# Altium footprint library Electronic Devices_LIB.PcbLib: 410 footprints (part 1 of 26)
Each footprint in its own frame and in the unit in brackets; x right, y up, seen from the top. Pads: shape width x height; smd on the part's side, far side on the other; paste and mask are expansions set on the pad; w line width, h text height; cw(c..) or ccw(c..) is an arc to the next point about the centre after c.
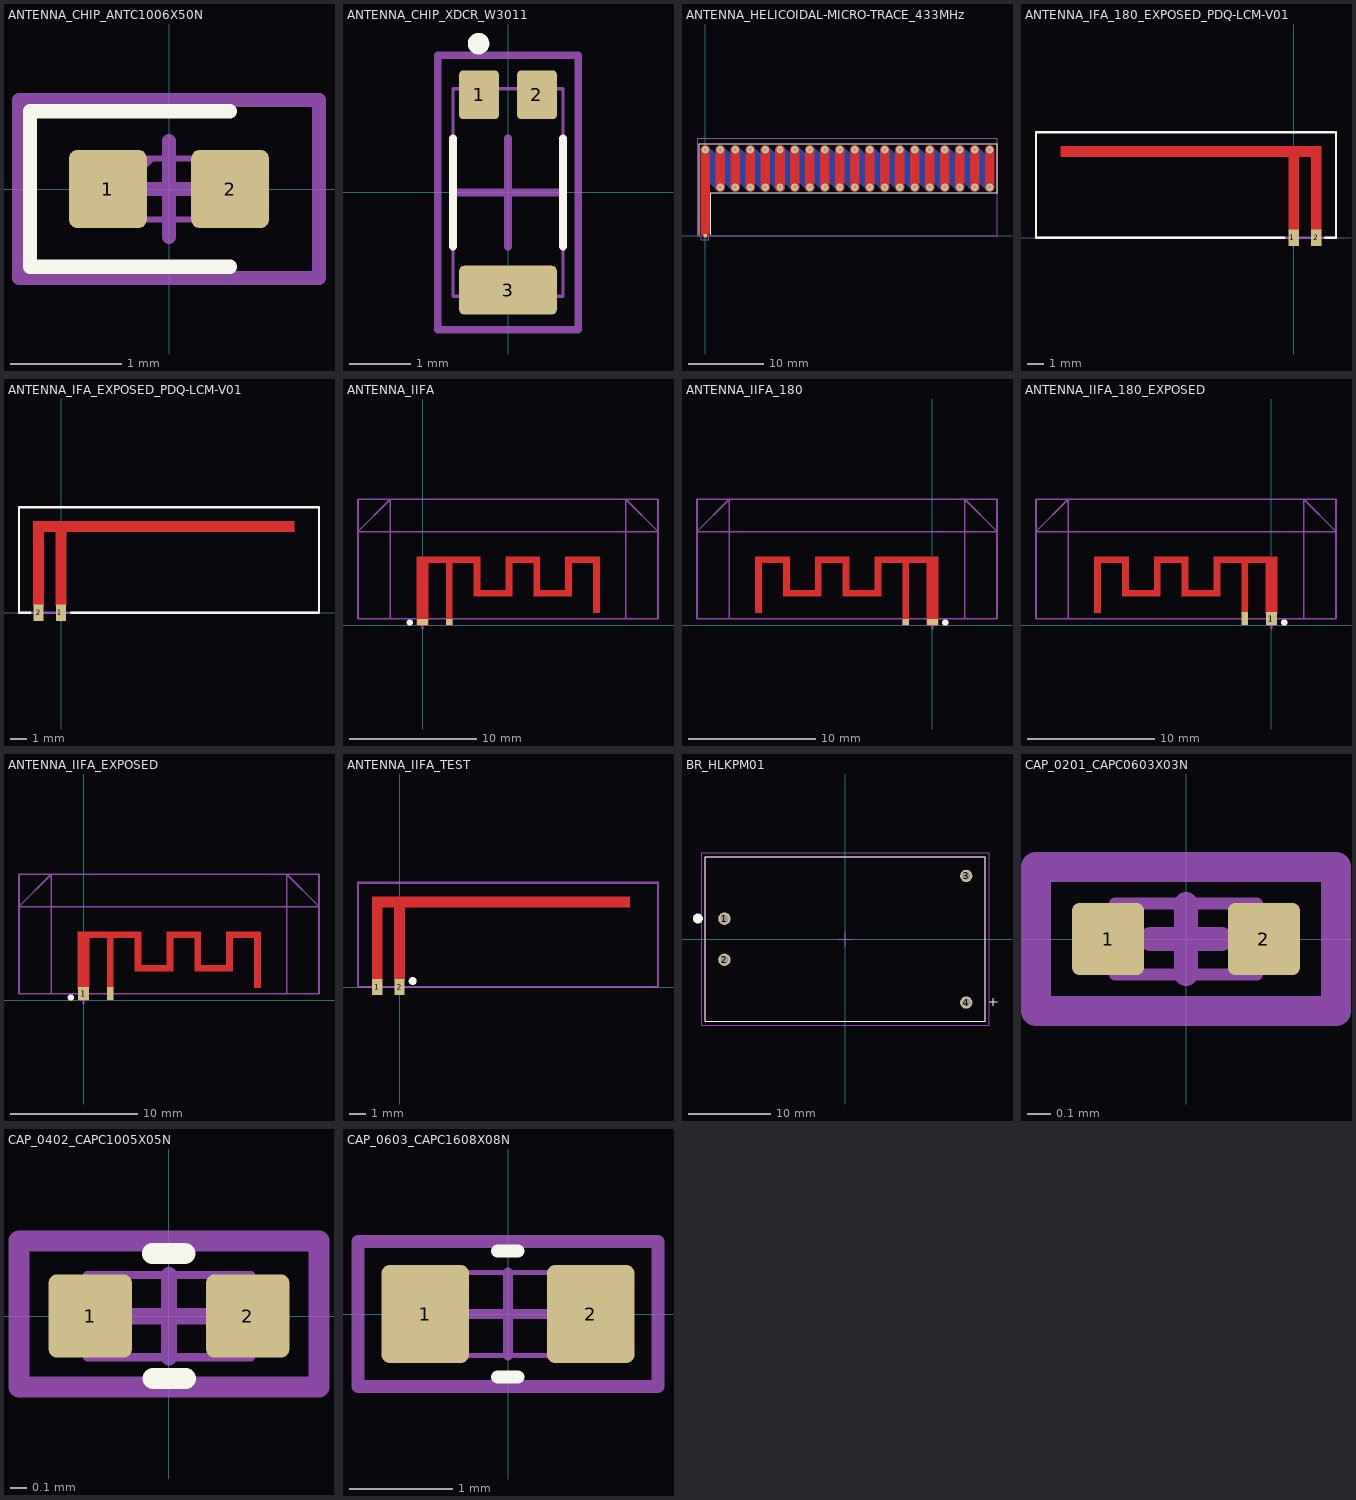
[diagram p0: the footprints below, top view; thin cyan lines are the x and y axes]

## ANTENNA_CHIP_ANTC1006X50N [mm] "1x0.55 mm"
height 0.4
pads (2):
  rrect20% 0.7x0.7 smd: 1(-0.55,0) 2(0.55,0)
Top Overlay:
  lines w0.127: 0.55,-0.7 -1.25,-0.7 -1.25,0.7 0.55,0.7
Mechanical 1:
  lines w0.051: -0.5,-0.075 -0.15,0.275 ; -0.5,-0.275 -0.5,0.275 0.5,0.275 0.5,-0.275 -0.5,-0.275
Top Assembly:
  text ".Designator" at -3.48,-0.275 h0.7
Top Courtyard:
  lines w0.127: -0.432,0 0,0 ; 0,-0.432 0,0 ; 0,0.432 0,0 ; 0.432,0 0,0 ; -1.35,-0.8 -1.35,0.8 1.35,0.8 1.35,-0.8 -1.35,-0.8
3D body "A9001978.stp": height 0.5, standoff 0, extent -0.5,-0.275 0.5,0.275

## ANTENNA_CHIP_XDCR_W3011 [mm]
pads (3):
  rrect20% 0.65x0.8 smd: 1(-0.475,1.6) 2(0.475,1.6)
  rrect20% 1.6x0.8 smd: 3(0,-1.6)
Top Overlay:
  circle w0.2: c-0.483,2.438 r0.076
  lines w0.127: -0.9,-0.887 -0.9,0.887 ; 0.9,-0.887 0.9,0.887
Top Paste:
  region: 0.75,1.25 0.2,1.25 0.2,1.95 0.75,1.95
  region: -0.2,1.25 -0.75,1.25 -0.75,1.95 -0.2,1.95
  region: 0.75,-1.95 -0.75,-1.95 -0.75,-1.25 0.75,-1.25
Top Solder:
  region: 0.85,1.15 0.1,1.15 0.1,2 0.85,2
  region: -0.1,1.15 -0.85,1.15 -0.85,2 -0.1,2
  region: 0.85,-2 -0.85,-2 -0.85,-1.15 0.85,-1.15
Top Assembly:
  lines w0.051: -0.9,-1.7 0.9,-1.7 0.9,1.7 -0.9,1.7 -0.9,-1.7
  text ".Designator" at -2.565,-0.161 h0.51
Top Courtyard:
  lines w0.127: -0.889,0 0,0 ; 0,-0.889 0,0 ; 0,0.889 0,0 ; 0.889,0 0,0 ; -1.15,-2.25 -1.15,2.25 1.15,2.25 1.15,-2.25 -1.15,-2.25

## ANTENNA_HELICOIDAL-MICRO-TRACE_433MHz [mil] "Micro Helical Trace Antenna, 433MHz, Must have matching network to achieve 50R"
pads (1):
  rrect20% 20x20 smd mask-1.97: 1(0,0)
via 1496.06,452.76 diameter 39.37 hole 14.96
via 1496.06,255.91 diameter 39.37 hole 14.96
via 1417.32,255.91 diameter 39.37 hole 14.96
via 1338.58,452.76 diameter 39.37 hole 14.96
via 1338.58,255.91 diameter 39.37 hole 14.96
via 1259.84,452.76 diameter 39.37 hole 14.96
via 1259.84,255.91 diameter 39.37 hole 14.96
via 1181.1,452.76 diameter 39.37 hole 14.96
via 1102.36,452.76 diameter 39.37 hole 14.96
via 1181.1,255.91 diameter 39.37 hole 14.96
via 1102.36,255.91 diameter 39.37 hole 14.96
via 1023.62,452.76 diameter 39.37 hole 14.96
via 1023.62,255.91 diameter 39.37 hole 14.96
via 944.88,452.76 diameter 39.37 hole 14.96
via 866.14,452.76 diameter 39.37 hole 14.96
via 944.88,255.91 diameter 39.37 hole 14.96
via 866.14,255.91 diameter 39.37 hole 14.96
via 787.4,452.76 diameter 39.37 hole 14.96
via 787.4,255.91 diameter 39.37 hole 14.96
via 78.74,452.76 diameter 39.37 hole 14.96
via 0,452.76 diameter 39.37 hole 14.96
via 78.74,255.91 diameter 39.37 hole 14.96
via 157.48,255.91 diameter 39.37 hole 14.96
via 157.48,452.76 diameter 39.37 hole 14.96
via 236.22,452.76 diameter 39.37 hole 14.96
via 236.22,255.91 diameter 39.37 hole 14.96
via 314.96,255.91 diameter 39.37 hole 14.96
via 314.96,452.76 diameter 39.37 hole 14.96
via 393.7,452.76 diameter 39.37 hole 14.96
via 393.7,255.91 diameter 39.37 hole 14.96
via 472.44,255.91 diameter 39.37 hole 14.96
via 472.44,452.76 diameter 39.37 hole 14.96
via 551.18,452.76 diameter 39.37 hole 14.96
via 551.18,255.91 diameter 39.37 hole 14.96
via 629.92,255.91 diameter 39.37 hole 14.96
via 629.92,452.76 diameter 39.37 hole 14.96
via 708.66,255.91 diameter 39.37 hole 14.96
via 708.66,452.76 diameter 39.37 hole 14.96
via 1417.32,452.76 diameter 39.37 hole 14.96
Top Layer:
  lines w50: 0,19.68 0,452.76 ; 78.74,255.91 78.74,452.76 ; 157.48,255.91 157.48,452.76 ; 236.22,255.91 236.22,452.76 ; 314.96,255.91 314.96,452.76 ; 393.7,255.91 393.7,452.76 ; 472.44,255.91 472.44,452.76 ; 551.18,255.91 551.18,452.76 ; 629.92,255.91 629.92,452.76 ; 708.66,255.91 708.66,452.76 ; 787.4,255.91 787.4,452.76 ; 866.14,255.91 866.14,452.76 ; 944.88,255.91 944.88,452.76 ; 1023.62,255.91 1023.62,452.76 ; 1102.36,255.91 1102.36,452.76 ; 1181.1,255.91 1181.1,452.76 ; 1259.84,255.91 1259.84,452.76 ; 1338.58,255.91 1338.58,452.76 ; 1417.32,255.91 1417.32,452.76 ; 1496.06,255.91 1496.06,452.76
Bottom Layer:
  lines w39.37: 629.92,255.91 629.92,255.91
  lines w50: 0,452.76 39.37,413.39 39.37,295.28 78.74,255.91 ; 78.74,452.76 118.11,413.39 118.11,295.28 157.48,255.91 ; 157.48,452.76 196.85,413.39 196.85,295.28 236.22,255.91 ; 236.22,452.76 275.59,413.39 275.59,295.28 314.96,255.91 ; 314.96,452.76 354.33,413.39 354.33,295.28 393.7,255.91 ; 393.7,452.76 433.07,413.39 433.07,295.28 472.44,255.91 ; 472.44,452.76 511.81,413.39 511.81,295.28 551.18,255.91 ; 551.18,452.76 590.55,413.39 590.55,295.28 629.92,255.91 ; 629.92,452.76 669.29,413.39 669.29,295.28 708.66,255.91 ; 708.66,452.76 748.03,413.39 748.03,295.28 787.4,255.91 ; 787.4,452.76 826.77,413.39 826.77,295.28 866.14,255.91 ; 866.14,452.76 905.51,413.39 905.51,295.28 944.88,255.91 ; 944.88,452.76 984.25,413.39 984.25,295.28 1023.62,255.91 ; 1023.62,452.76 1062.99,413.39 1062.99,295.28 1102.36,255.91 ; 1102.36,452.76 1141.73,413.39 1141.73,295.28 1181.1,255.91 ; 1181.1,452.76 1220.47,413.39 1220.47,295.28 1259.84,255.91 ; 1259.84,452.76 1299.21,413.39 1299.21,295.28 1338.58,255.91 ; 1338.58,452.76 1377.95,413.39 1377.95,295.28 1417.32,255.91 ; 1417.32,452.76 1456.69,413.39 1456.69,295.28 1496.06,255.91
Top Overlay:
  lines w5: -30,5 -30,485 1535.43,485 1535.43,225 30,225 30,5
Bottom Overlay:
  lines w5: -30,5 -30,485 740,485 ; 30,5 30,225 740,225
Top Courtyard:
  lines w5: -39,0 -39,511.81 1535.43,511.81 1535.43,0 20,0 20,-20 -20,-20 -20,0 -39,0
Multi-Layer:
  pour cut-out: 1535.43,0 1535.43,510 -43,510 -43,0

## ANTENNA_IFA_180_EXPOSED_PDQ-LCM-V01 [mil] "Straight IFA, exposed Cu, PDQ Spirit LCM, v01, Flipped 180 deg"
pads (2):
  rrect5% 25x40 smd paste+0 mask+2: "1 "(0,0) 2(55,0)
Top Layer:
  region: 67.5,17.5 42.5,17.5 42.5,197.5 12.5,197.5 12.5,17.5 -12.5,17.5 -12.5,197.5 -567.5,197.5 -567.5,222.5 67.5,222.5
Top Overlay:
  lines w5: -23,0 -627,0 -627,257 103,257 103,0 76,0
Top Courtyard:
  lines w5: 0,-20 0,20 ; -627.5,0 15,0 40,0 70,0 102.5,0 102.5,257.5 -557.5,257.5 -627.5,257.5 -627.5,0

## ANTENNA_IFA_EXPOSED_PDQ-LCM-V01 [mil] "Straight IFA, exposed Cu, PDQ Spirit LCM, v01"
pads (2):
  rect 25x40 smd paste+0 mask+2: "1 "(0,0) 2(-55,0)
Top Layer:
  region: -67.5,17.5 -42.5,17.5 -42.5,197.5 -12.5,197.5 -12.5,17.5 12.5,17.5 12.5,197.5 567.5,197.5 567.5,222.5 -67.5,222.5
Top Overlay:
  lines w5: -75,0 -102,0 -102,257 628,257 628,0 24,0
Top Courtyard:
  lines w5: 0,-20 0,20 ; -102.5,0 -70,0 -40,0 -15,0 627.5,0 627.5,257.5 557.5,257.5 -102.5,257.5 -102.5,0

## ANTENNA_IIFA [mm]
pads (2):
  rect 0.9x0.5 smd paste-1 mask-1: 1(0,0.25)
  rect 0.5x0.5 smd paste-1 mask-1: 2(2.1,0.25)
Top Layer:
  region: -0.45,0 -0.45,5.4 4.55,5.4 4.55,2.76 6.55,2.76 6.55,5.4 9.25,5.4 9.25,2.76 11.25,2.76 11.25,5.4 13.95,5.4 13.95,0.96 13.45,0.96 13.45,4.9 11.75,4.9 11.75,2.26 8.75,2.26 8.75,4.9 7.05,4.9 7.05,2.26 4.05,2.26 4.05,4.9 2.35,4.9 2.35,0 1.85,0 1.85,4.9 0.45,4.9 0.45,0
Top Overlay:
  circle w0.3: c-1,0.205 r0.1
Top Assembly:
  text ".Designator" at 4.42,7.916 h0.51
Top Courtyard:
  lines w0.127: -0.279,0 0,0 ; 0,-0.279 0,0 ; 0,0.279 0,0 ; 0.279,0 0,0 ; -2.54,0.508 16.002,0.508 ; -2.54,0.508 -2.54,7.366 ; -2.54,0.508 -5.08,0.508 -5.08,9.906 18.542,9.906 18.542,0.508 16.002,0.508 ; -2.54,7.366 16.002,7.366 ; -2.54,7.366 -5.08,7.366 -2.54,9.906 -2.54,7.366 ; 16.002,0.508 16.002,7.366 ; 16.002,7.366 18.542,7.366 16.002,9.906 16.002,9.652 16.002,7.366

## ANTENNA_IIFA_180 [mm] "IIFA Antenna mirrored 180 degrees"
pads (2):
  rect 0.9x0.5 smd paste-1 mask-1: 1(0,0.25)
  rect 0.5x0.5 smd paste-1 mask-1: 2(-2.1,0.25)
Top Layer:
  region: 0.45,0 0.45,5.4 -4.55,5.4 -4.55,2.76 -6.55,2.76 -6.55,5.4 -9.25,5.4 -9.25,2.76 -11.25,2.76 -11.25,5.4 -13.95,5.4 -13.95,0.96 -13.45,0.96 -13.45,4.9 -11.75,4.9 -11.75,2.26 -8.75,2.26 -8.75,4.9 -7.05,4.9 -7.05,2.26 -4.05,2.26 -4.05,4.9 -2.35,4.9 -2.35,0 -1.85,0 -1.85,4.9 -0.45,4.9 -0.45,0
Top Overlay:
  circle w0.3: c1,0.205 r0.1
Top Assembly:
  text ".Designator" at -9.296,8.272 h0.51
Top Courtyard:
  lines w0.127: -0.279,0 0,0 ; 0,-0.279 0,0 ; 0,0.279 0,0 ; 0.279,0 0,0 ; -16.002,0.508 2.54,0.508 ; -16.002,0.508 -16.002,7.366 ; -16.002,0.508 -18.542,0.508 -18.542,9.906 5.08,9.906 5.08,0.508 2.54,0.508 ; -16.002,7.366 2.54,7.366 ; -16.002,7.366 -18.542,7.366 -16.002,9.906 -16.002,9.652 -16.002,7.366 ; 2.54,0.508 2.54,7.366 ; 2.54,7.366 5.08,7.366 2.54,9.906 2.54,7.366

## ANTENNA_IIFA_180_EXPOSED [mil] "IIFA Antenna mirrored 180 degrees"
pads (2):
  rect 35.43x40 smd paste-39.37 mask-39.37: 1(0,20)
  rect 19.68x40 smd paste-39.37 mask-39.37: 2(-82.68,20)
Top Layer:
  region: 17.72,35 17.72,212.6 -179.13,212.6 -179.13,108.66 -257.87,108.66 -257.87,212.6 -364.17,212.6 -364.17,108.66 -442.91,108.66 -442.91,212.6 -549.21,212.6 -549.21,37.8 -529.53,37.8 -529.53,192.91 -462.6,192.91 -462.6,88.98 -344.49,88.98 -344.49,192.91 -277.56,192.91 -277.56,88.98 -159.45,88.98 -159.45,192.91 -92.52,192.91 -92.52,35 -72.83,35 -72.83,192.91 -17.72,192.91 -17.72,35
Top Overlay:
  circle w11.81: c39.37,8.09 r3.94
Top Solder:
  rectangle: -94.49,20 -70.87,35
  rectangle: -19.68,20 19.68,35
Top Assembly:
  text ".Designator" at -375,334.66 h20
Top Courtyard:
  lines w5: -11,0 0,0 ; 0,-11 0,0 ; 0,11 0,0 ; 11,0 0,0 ; -630,20 100,20 ; -630,20 -630,290 ; -630,20 -730,20 -730,390 200,390 200,20 100,20 ; -630,290 100,290 ; -630,290 -730,290 -630,390 -630,380 -630,290 ; 100,20 100,290 ; 100,290 200,290 100,390 100,290

## ANTENNA_IIFA_EXPOSED [mil]
pads (2):
  rect 35.43x40 smd paste-39.37 mask-39.37: 1(0,20)
  rect 19.68x40 smd paste-39.37 mask-39.37: 2(82.68,20)
Top Layer:
  region: -17.72,35 -17.72,212.6 179.13,212.6 179.13,108.66 257.87,108.66 257.87,212.6 364.17,212.6 364.17,108.66 442.91,108.66 442.91,212.6 549.21,212.6 549.21,37.8 529.53,37.8 529.53,192.91 462.6,192.91 462.6,88.98 344.49,88.98 344.49,192.91 277.56,192.91 277.56,88.98 159.45,88.98 159.45,192.91 92.52,192.91 92.52,35 72.83,35 72.83,192.91 17.72,192.91 17.72,35
Top Overlay:
  circle w11.81: c-39.37,8.09 r3.94
Top Solder:
  rectangle: 70.87,20 94.49,35
  rectangle: -19.68,20 19.68,35
Top Assembly:
  text ".Designator" at 146,328.66 h20
Top Courtyard:
  lines w5: -11,0 0,0 ; 0,-11 0,0 ; 0,11 0,0 ; 11,0 0,0 ; -100,20 -200,20 -200,390 730,390 730,20 630,20 ; -100,20 -100,290 ; -100,20 630,20 ; -100,290 -100,390 -200,290 -100,290 ; -100,290 630,290 ; 630,20 630,290 ; 630,290 630,380 630,390 730,290 630,290

## ANTENNA_IIFA_TEST [mil]
pads (2):
  rrect5% 25x40 smd paste-39.37 mask+2: 1(-55,0) 2(0,0)
Top Layer:
  region: -67.5,17.5 -42.5,17.5 -42.5,197.5 -12.5,197.5 -12.5,17.5 12.5,17.5 12.5,197.5 567.5,197.5 567.5,222.5 -67.5,222.5
Top Overlay:
  circle w11.81: c32.5,15 r3.94
Top Assembly:
  text ".Designator" at 156,105.66 h20
Top Courtyard:
  lines w5: -102.5,0 -102.5,257.5 557.5,257.5 637.5,257.5 637.5,0 -15,0 -40,0 -70,0 -102.5,0

## BASE BOARD 3D [mm] "MODEL 3D BASE BOARD"
3D body "MGP BASE_V1.0 RevA_A_2024-03-18.step": height 24.48, standoff -3.17, extent 0,0 65,49.374

## BR_HLKPM01 [mm]
pads (4):
  round 1.5 hole 1: 1(-14.7,2.5) 2(-14.7,-2.5) 3(14.7,7.7) 4(14.7,-7.7)
Top Overlay:
  lines w0.1: -17,-10 17,-10 17,10 -17,10 -17,-10
  lines w0.127: 17.526,-7.62 18.44,-7.62 ; 17.983,-8.077 17.983,-7.163
  lines w1: -18.032,2.515 ccw(c-17.932,2.515) -17.832,2.515 ccw(c-17.932,2.515) -18.032,2.515
Top Assembly:
  lines w0.051: -17,-10 17,-10 17,10 -17,10 -17,-10
  text ".Designator" at -2.235,0.144 h0.51
Top Courtyard:
  lines w0.127: -0.889,0 0,0 ; 0,-0.889 0,0 ; 0,0.889 0,0 ; 0.889,0 0,0 ; -17.45,-10.465 17.526,-10.465 17.526,10.516 -17.45,10.516 -17.45,-10.465
3D body "HLK-PM01.stp": height 15.05, standoff -5, extent -17,-10 17,10

## CAMERA MODULE OUTLINE [mm]

## CAP_0201_CAPC0603X03N [mm] "Chip Capacitor, 2-Leads, Body 0.60x0.30mm, IPC Medium Density"
height 0.3
pads (2):
  rrect20% 0.305x0.305 smd mask+0.076: 1(-0.33,0) 2(0.33,0)
Top Assembly:
  lines w0.051: -0.3,-0.15 0.3,-0.15 0.3,0.15 -0.3,0.15 -0.3,-0.15
  text ".Designator" at -2.692,-0.161 h0.51
Top Courtyard:
  lines w0.1: -0.15,0 0.15,0 ; 0,-0.15 0,0.15
  lines w0.127: -0.635,-0.305 0.635,-0.305 0.635,0.305 -0.635,0.305 -0.635,-0.305
3D body "CAP_0201_CAPC0603X03N.step": height 0.3, standoff 0, extent -0.3,-0.15 0.3,0.15

## CAP_0402_CAPC1005X05N [mil] "Chip Capacitor, 2-Leads, Body 1.00x0.50mm, IPC Medium Density"
height 19.68
pads (2):
  rrect20% 20x20 smd: 1(-18.9,0) 2(18.9,0)
Top Overlay:
  lines w5: -4,15 3.87,15 ; -3.87,-15 4,-15
Top Assembly:
  lines w2: -19.68,-9.84 19.69,-9.84 19.69,9.84 -19.68,9.84 -19.68,-9.84
  text ".Designator" at -87,-6.34 h20
Top Courtyard:
  lines w3.94: -9.84,0 9.84,0 ; 0,-9.84 0,9.84
  lines w5: -36,-17 -36,18 36,18 36,-17 -36,-17
3D body "CAP_0402_CAPC1005X05N.step": height 19.68, standoff 0, extent -19.68,-9.84 19.68,9.84

## CAP_0603_CAPC1608X08N [mm] "Chip Capacitor, 2-Leads, Body 1.60x0.80mm, IPC Medium Density"
height 0.8
pads (2):
  rrect20% 0.85x0.95 smd: 1(-0.8,0) 2(0.8,0)
Top Overlay:
  lines w0.127: -0.102,-0.61 0.098,-0.61 ; -0.102,0.61 0.098,0.61
Top Assembly:
  lines w0.051: -0.8,-0.4 0.8,-0.4 0.8,0.4 -0.8,0.4 -0.8,-0.4
  text ".Designator" at -2.489,-0.161 h0.51
Top Courtyard:
  lines w0.1: -0.4,0 0.4,0 ; 0,-0.4 0,0.4
  lines w0.127: -1.45,-0.7 -1.45,0.7 1.45,0.7 1.45,-0.7 -1.45,-0.7
3D body "CAP0603.stp": height 0.3, standoff 0, extent -0.8,-0.4 0.8,0.4